# Altium schematic symbol library lib_datalogger.SchLib: 1246 symbols (part 5 of 16)
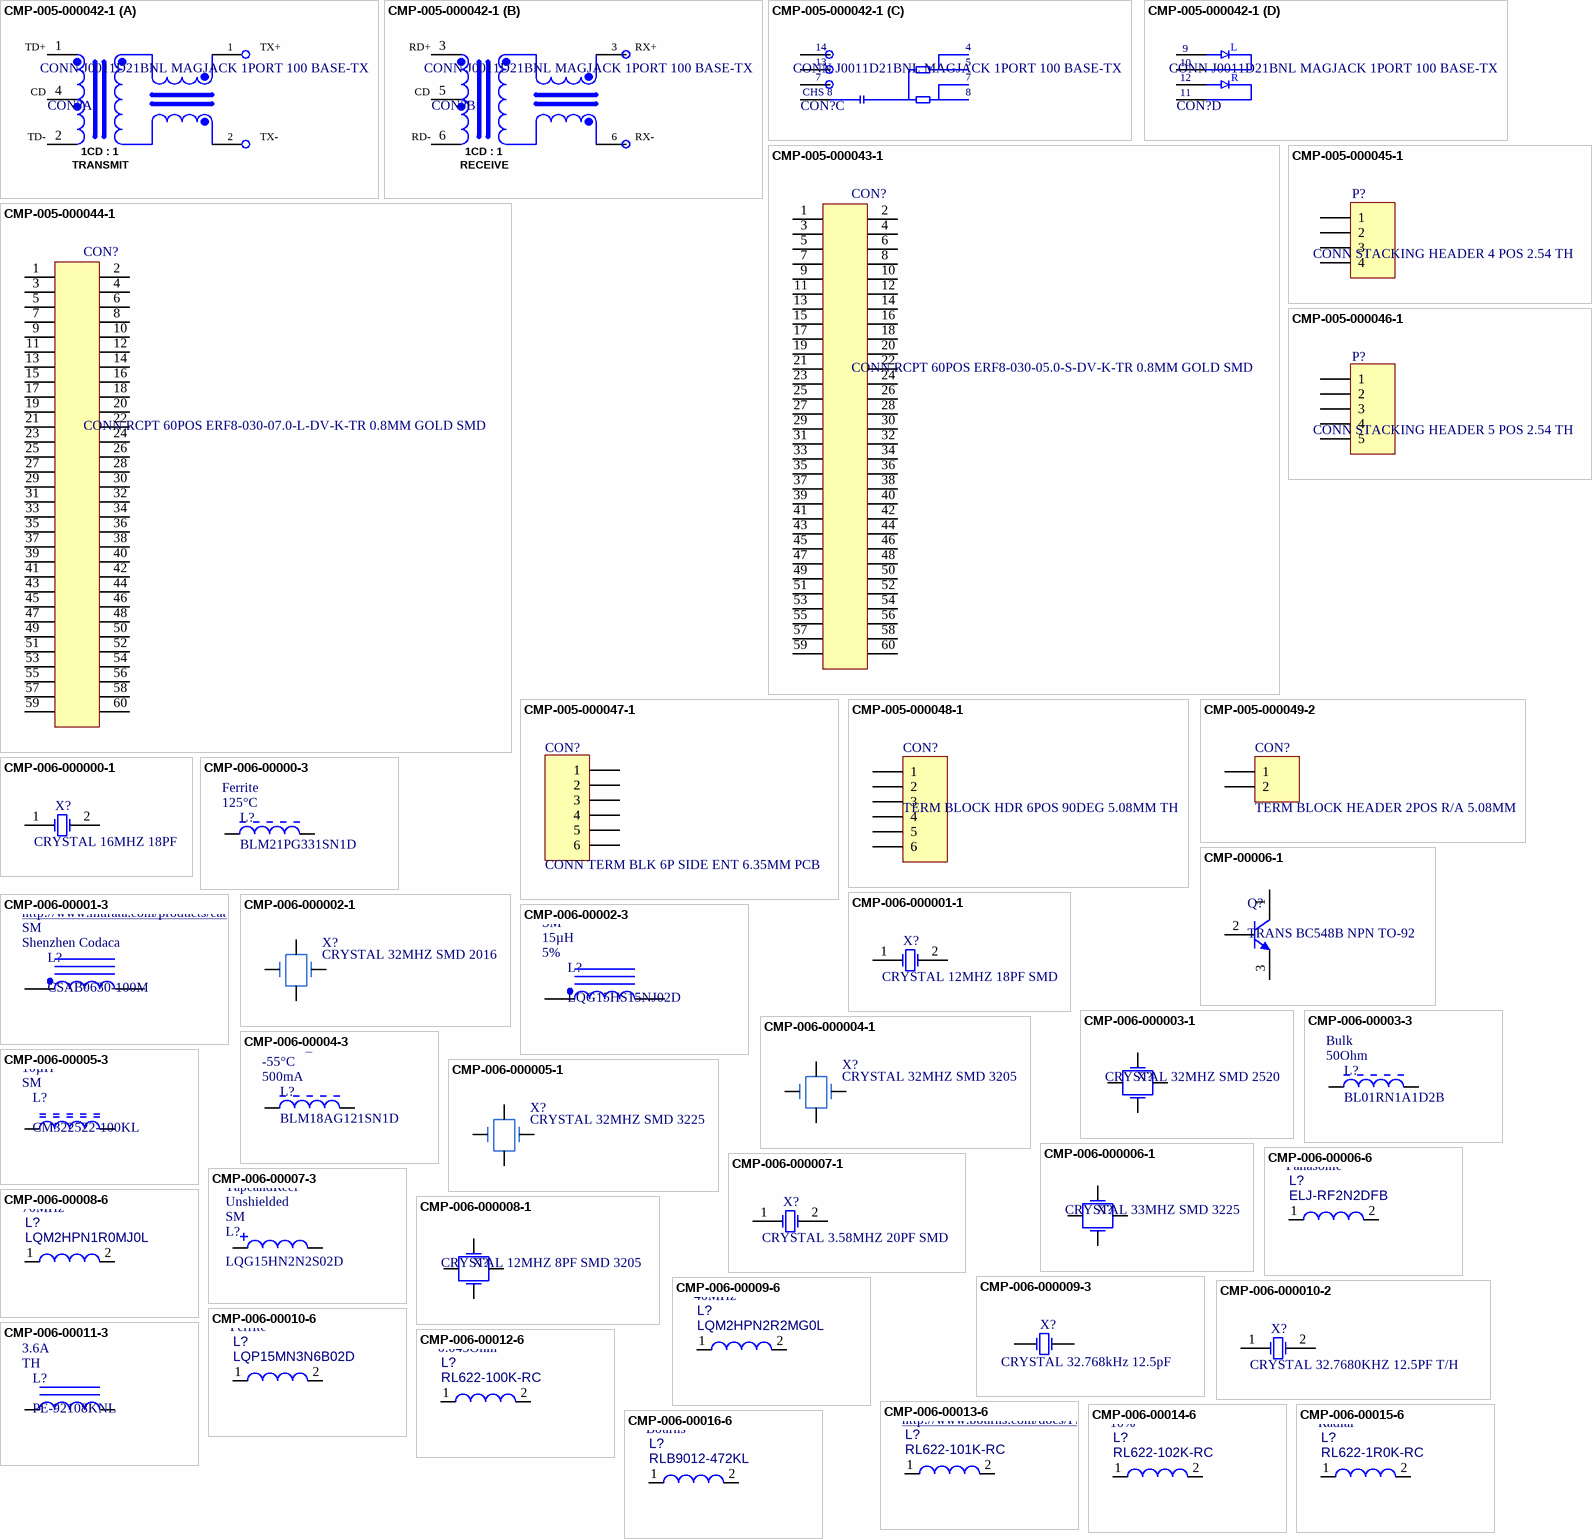
[diagram p47: symbols CMP-005-000042-1 to CMP-006-00016-6]

## CMP-005-000042-1
designator CON?, comment CONN J0011D21BNL MAGJACK 1PORT 100 BASE-TX
CONN MAGJACK 1PORT 100 BASE-TX; Manufacturer: Pulse Electronics Corporation; LED Color: Green - Yellow; Shielding: Shielded, EMI Finger; Number of Cores per Jack: 4; Number of Ports: 1; Tab Direction: Down; Shield Material: Brass; Connector Type: RJ45; Pricing 1: 1=7.92, 10=7.59, 25=6.93, 50=6.6, 100=6.27, 250=5.61, 500=5.28, 1000=4.62 (USD); Mounting Type: Through Hole; Stock 1: 4306; Height Above Board: 0.545" (13.84mm); Category: Connectors, Interconnects; Part Status: Active; Contact Material: Phosphor Bronze; Termination: Solder; Source: mits.SchLib; Number of Rows: 1; Operating Temperature: 0°C ~ 70°C; RoHS: RoHS Compliant; Contact Finish: Gold; ComponentLink1Description: http://productfinder.pulseeng.com/products/datasheets/J403.pdf; Orientation: 90° Angle (Right); Manufacturer Part Number: J0011D21BNL; Housing Material: Thermoplastic; Applications: 10/100 Base-TX, AutoMDIX; Design Item ID: CONN J0011D21BNL MAGJACK 1PORT 100 BASE-TX; ComponentLink1URL: http://productfinder.pulseeng.com/products/datasheets/J403.pdf; Contact Finish Thickness: 15µin (0.38µm); Packaging: Tube; Features: Board Guide
footprint J0011
footprint J0011
part A pins: 1 TD+, 2 TD-, 4 CT
part B pins: 3 RD+, 5 CT, 6 RD-
part C pins: 7, 8, 13, 14
part D pins: 9, 10, 11, 12
part A text: 1         TX+; CD; 2         TX-; 1CD : 1; TRANSMIT
part B text: 3      RX+; CD; 6      RX-; 1CD : 1; RECEIVE
part C text: CHS 8
part D text: L; R

## CMP-005-000043-1
designator CON?, comment CONN RCPT 60POS ERF8-030-05.0-S-DV-K-TR 0.8MM GOLD SMD
CONN RCPT 60POS 0.8MM GOLD SMD; Manufacturer: Samtec Inc.; Mated Stacking Heights: 7mm, 10mm, 13mm, 14mm, 20mm; Connector Type: Socket, Center Strip Contacts; Number of Positions: 60; Pitch: 0.031" (0.80mm); Design Item ID: CONN RCPT 60POS ERF8-030-05.0-S-DV-K-TR 0.8MM GOLD SMD; Manufacturer Part Number: ERF8-030-05.0-S-DV-K-TR; Contact Finish Thickness: 30µin (0.76µm); Source: mits.SchLib; Part Status: Active; Contact Finish: Gold; Mounting Type: Surface Mount; Category: Connectors, Interconnects; Height Above Board: 0.210" (5.33mm); Pricing 1: 1=8.69, 10=8.324, 25=7.6, 50=7.238, 100=6.8761 (USD); Packaging: Cut Tape (CT); RoHS: RoHS Compliant; Features: Board Guide, Pick and Place; ComponentLink1Description: http://suddendocs.samtec.com/prints/erf8-xxx-xx.x-x-dv-xxxx-xx-mkt.pdf; Stock 1: 735; ComponentLink1URL: http://suddendocs.samtec.com/prints/erf8-xxx-xx.x-x-dv-xxxx-xx-mkt.pdf; Number of Rows: 2
footprint ERF8-030-07.0-L-DV-TR
footprint ERF8-030-05.0-X-DV
pins: 1, 2, 3, 4, 5, 6, 7, 8, 9, 10, 11, 12, 13, 14, 15, 16, 17, 18, 19, 20, 21, 22, 23, 24, 25, 26, 27, 28, 29, 30, 31, 32, 33, 34, 35, 36, 37, 38, 39, 40, 41, 42, 43, 44, 45, 46, 47, 48, 49, 50, 51, 52, 53, 54, 55, 56, 57, 58, 59, 60

## CMP-005-000044-1
designator CON?, comment CONN RCPT 60POS ERF8-030-07.0-L-DV-K-TR 0.8MM GOLD SMD
CONN RCPT 60POS 0.8MM GOLD SMD; Manufacturer: Samtec Inc; eVendor#: ERF8-030-07.0-L-DV-EGPS-TR-ND; Obs: Comprar diretamente coma  SAMTEC; eVendor: Digi-Key; eVendorPrice: 4,5095; Part#: ERF8-030-07.0-L-DV-K-TR; Source: mits.SchLib; Design Item ID: CONN RCPT 60POS ERF8-030-07.0-L-DV-K-TR 0.8MM GOLD SMD; MSRP: 4,5095; MOQ: 300; Datasheet: http://www.samtec.com/ftppub/cpdf/ERF8-XXX-XX.X-X-DV-XXXX-TR-MKT.pdf
footprint ERF8-030-07.0-L-DV-TR
footprint ERF8-030-07.0-L-DV-TR
pins: 1, 2, 3, 4, 5, 6, 7, 8, 9, 10, 11, 12, 13, 14, 15, 16, 17, 18, 19, 20, 21, 22, 23, 24, 25, 26, 27, 28, 29, 30, 31, 32, 33, 34, 35, 36, 37, 38, 39, 40, 41, 42, 43, 44, 45, 46, 47, 48, 49, 50, 51, 52, 53, 54, 55, 56, 57, 58, 59, 60

## CMP-005-000045-1
designator P?, comment CONN STACKING HEADER 4 POS 2.54 TH
Conn Unshrouded Header HDR 4 POS 2.54mm Solder ST Thru-Hole; Manufacturer: Samtec; Manufacturer Part Number: HTSW-150-20-TM-S; Gender: Male; Max Voltage Rating (AC): 550V; Number of Contacts: 50; Max Current Rating: 7.6A; ComponentLink2Description: https://datasheet.ciiva.com/9714/htsw-th-9714606.pdf?src-supplier=Avnet; Category: Connectors; Number of Rows: 1; ComponentLink1URL: https://datasheet.ciiva.com/29150/77311-29150409.pdf?src-supplier=Digi-Key; ComponentLink2URL: https://datasheet.ciiva.com/9714/htsw-th-9714606.pdf?src-supplier=Avnet; Contact Plating: Tin; Design Item ID: CONN STACKING HEADER 4 POS 2.54 TH; RoHS: Yes; Max Operating Temperature: 105°C; Contact Material: Bronze; Termination: Solder; Orientation: Straight; Depth: 2.48mm; Pitch: 2.54mm; Length: 127mm; Min Operating Temperature: -55°C; Housing Color: Natural; ComponentLink1Description: https://datasheet.ciiva.com/29150/77311-29150409.pdf?src-supplier=Digi-Key; RoHS Compliant: Yes; Housing Material: Polymer; Source: mits.SchLib
footprint CONN_STACKING_HEADER_4POS
footprint CONN_STACKING_HEADER_4POS
pins: 1, 2, 3, 4

## CMP-005-000046-1
designator P?, comment CONN STACKING HEADER 5 POS 2.54 TH
Conn Unshrouded Header HDR 5 POS 2.54mm Solder ST Thru-Hole; Manufacturer: Samtec; Manufacturer Part Number: HTSW-150-20-TM-S; Max Voltage Rating (AC): 550V; Number of Contacts: 50; Max Current Rating: 7.6A; Gender: Male; Pitch: 2.54mm; ComponentLink2Description: https://datasheet.ciiva.com/16733/77311-16733275.pdf?src-supplier=Avnet+Europe; Termination: Solder; RoHS Compliant: Yes; Contact Material: Bronze; ComponentLink4Description: https://datasheet.ciiva.com/9714/htsw-th-9714606.pdf?src-supplier=Avnet; Contact Plating: Tin; ComponentLink1URL: https://datasheet.ciiva.com/10149/77311-10149019.pdf?src-supplier=Avnet; ComponentLink2URL: https://datasheet.ciiva.com/16733/77311-16733275.pdf?src-supplier=Avnet+Europe; Length: 127mm; RoHS: Yes; ComponentLink3Description: https://datasheet.ciiva.com/724/77311-724067.pdf?src-supplier=Digi-Key; Orientation: Straight; Pricing 1: 1=4,62000, 10=4,43600, 100=3,69660, 500=3,14212, 1000=2,68004 (USD); Stock 1: 132; Max Operating Temperature: 105°C; Housing Material: Polymer; Design Item ID: CONN STACKING HEADER 5 POS 2.54 TH; Source: mits.SchLib; ComponentLink3URL: https://datasheet.ciiva.com/724/77311-724067.pdf?src-supplier=Digi-Key; Housing Color: Natural; Category: Connectors; ComponentLink1Description: https://datasheet.ciiva.com/10149/77311-10149019.pdf?src-supplier=Avnet; Depth: 2.48mm; Number of Rows: 1; Min Operating Temperature: -55°C; ComponentLink4URL: https://datasheet.ciiva.com/9714/htsw-th-9714606.pdf?src-supplier=Avnet
footprint CONN_STACKING_HEADER_5POS
footprint CONN_STACKING_HEADER_5POS
pins: 1, 2, 3, 4, 5

## CMP-005-000047-1
designator CON?, comment CONN TERM BLK 6P SIDE ENT 6.35MM PCB
Conn PC Terminal Block 6 POS 6.35mm Solder ST Thru-Hole 41A Cardboard; Manufacturer Part Number: 920-0085-01; Manufacturer: SchmartBoard; Voltage: 600V; Number of Levels: 1; Wire Gauge (Min): 10AWG; Wire Gauge (Max): 24AWG; Current: 30A; Number of Positions Per Level: 6; Packaging: Bulk; Color: Green; Mount: Through Hole; Design Item ID: CONN TERM BLK 6P SIDE ENT 6.35MM PCB; ComponentLink1URL: http://www.mouser.com/ds/2/356/schmartboard_pd_920-0085-01_b-539867.pdf?src-supplier=Mouser; ComponentLink1Description: http://www.mouser.com/ds/2/356/schmartboard_pd_920-0085-01_b-539867.pdf?src-supplier=Mouser; Contact Plating: Tin; RoHS: No; Stock 1: 36; Termination: Screwless; Pricing 1: 1=5,38000, 10=5,23200, 50=4,89000, 100=4,49870, 250=4,15644, 500=3,96082, 1000=3,71632 (USD); Source: mits.SchLib; ComponentLink2URL: https://media.digikey.com/pdf/Data%20Sheets/Phoenix%20Contact%20PDFs/1017525_Ds.pdf?src-supplier=Digi-Key; ComponentLink2Description: https://media.digikey.com/pdf/Data%20Sheets/Phoenix%20Contact%20PDFs/1017525_Ds.pdf?src-supplier=Digi-Key; Category: Headers and Wire Housings
pins: 1, 2, 3, 4, 5, 6

## CMP-005-000048-1
designator CON?, comment TERM BLOCK HDR 6POS 90DEG 5.08MM TH
PIN HEADER, EUROSTYLE, 6POS, 0.2IN; Connector Type:Terminal Block, Eurostyle; Product Range:39860 Series; Connector Mounting:PCB Mount; Pitch Spacing:5.08mm; No. of Contacts:6; Wire Size AWG Min:-; Wire Size AWG Max:-; Colour:Black ;RoHS Compliant: Yes; Manufacturer Part Number: 39532-1006; Manufacturer: Molex Connector Corporation; Current rating: 15A; Voltage: 300V; Number of Contacts: 6; Gender: Male; Pitch: 0.200" (5.08mm); Material Flammability Rating: UL94 V-0; Contact Tail Length: 0.150" (3.81mm); Header Orientation: 90°, Right Angle; Max Voltage Rating (DC): 300.3kV; Number of Levels: 1; ELV: Compliant; ComponentLink2URL: https://datasheet.ciiva.com/5190/0395321006-terminal-blocks-166209-5190898.pdf?src-supplier=Mouser; ComponentLink3Description: https://datasheet.ciiva.com/7978/1480852-7978999.pdf?src-supplier=Element14; ComponentLink1URL: http://www.molex.com/pdm_docs/sd/395321002_sd.pdf; Housing Color: Black; Current - UL: 15A; Features: -; ComponentLink4URL: https://datasheet.ciiva.com/810/395321002-sd-810100.pdf?src-supplier=Digi-Key; Category: Connectors, Interconnects; Ingress Protection: -; ComponentLink1Description: http://www.molex.com/pdm_docs/sd/395321002_sd.pdf; Number of Positions: 6; Number of Rows: 1; Max Operating Temperature: 105°C; Contact Plating: Tin; Wire Strip Length: -; ComponentLink3URL: https://datasheet.ciiva.com/7978/1480852-7978999.pdf?src-supplier=Element14; Min Operating Temperature: -40°C; Plug Wire Entry: -; Stock 1: 8671; Current: 15A; Current - IEC: -; Stock 2: 3509; Length: 32.5mm; Type: Header, Male Pins, Shrouded (4 Side); Number of Circuits: 6; Package Quantity: 1; Flammability Rating: UL94 V-0; Lead Free: Lead Free; Contact Material: Brass; Voltage - UL: 300V; Voltage Rating: 300V; Mount: Through Hole; ComponentLink2Description: https://datasheet.ciiva.com/5190/0395321006-terminal-blocks-166209-5190898.pdf?src-supplier=Mouser; Source: mits.SchLib; Mounting Type: Through Hole; Operating Temperature: -40°C ~ 105°C; RoHS: RoHS Compliant; Termination: Solder; Part Status: Active; Wire Gauge or Range - AWG: -; Pricing 2: 1=1,81000, 10=1,64100, 100=1,40670, 500=1,17228, 1000=1,00481, 5000=0,89093, 10000=0,87083 (USD); Orientation: Right Angle; ComponentLink4Description: https://datasheet.ciiva.com/810/395321002-sd-810100.pdf?src-supplier=Digi-Key; Packaging: Bulk; Screw Size: -; Wire Gauge or Range - mm²: -; Pricing 1: 1=1.7, 10=1.544, 50=1.386, 100=1.323, 250=1.197, 500=1.1025, 1000=0.945, 2500=0.882, 5000=0.8379 (USD); Housing Material: Polyamide (PA66), Nylon 6/6; Positions Per Level: 6; Voltage - IEC: -; Number of Positions Per Level: 6; Insulation Height: 0.472" (12.00mm); Contact Mating Finish: Tin; Connector Type: Terminal Block; Termination Style: Solder; Torque - Screw: -; Width: 12mm; Color: Black; Design Item ID: TERM BLOCK HDR 6POS 90DEG 5.08MM TH
footprint TERMINAL_BLOCKS_MSTB_6POS
footprint TERMINAL_BLOCKS_MSTB_6POS
pins: 1, 2, 3, 4, 5, 6

## CMP-005-000049-2
designator CON?, comment TERM BLOCK HEADER 2POS R/A 5.08MM
TERM BLOCK HDR 2POS R/A 5.08MM; Manufacturer: Phoenix Contact; Manufacturer Part Number: 1757242; Number of Positions: 2; Voltage - IEC: 400V; Current - UL: 15A; Header Orientation: 90°, Right Angle; Voltage - UL: 300V; Number of Levels: 1; Current - IEC: 12A; Pitch: 0.200" (5.08mm); Plug Wire Entry: -; Features: -; Operating Temperature: -; Contact Mating Finish: Tin; Source: mits.SchLib; Wire Gauge or Range - AWG: -; Color: Green; Category: Connectors, Interconnects; Part Status: Active; Termination Style: Solder; Design Item ID: TERM BLOCK HEADER 2POS R/A 5.08MM; RoHS: RoHS Compliant; Mounting Type: Through Hole; Wire Gauge or Range - mm²: -; Pricing 1: 1=0.59, 10=0.563, 50=0.5386, 100=0.5239, 250=0.4896, 500=0.45044, 1000=0.408, 2500=0.3888, 5000=0.3648 (USD); ComponentLink1URL: http://media.digikey.com/pdf/Data%20Sheets/Phoenix%20Contact%20PDFs/1757242.pdf; Stock 1: 14081; Type: Header, Male Pins, Shrouded (4 Side); Positions Per Level: 2; ComponentLink1Description: http://media.digikey.com/pdf/Data%20Sheets/Phoenix%20Contact%20PDFs/1757242.pdf; Packaging: Bulk
footprint MSTBA 2G
footprint MSTBA 2G
pins: 1, 2

## CMP-006-000000-1
designator X?, comment CRYSTAL 16MHZ 18PF
16.000MHZ-B2.            Crystal; Manufacturer Part Number: HCM4912000000ABJT; Manufacturer: Citizen Finedevice Co Ltd; Frequency: 12MHz; Series Resistance: 40R; Frequency Stability: ±50ppm; Operating Mode: Fundamental; ESR (Equivalent Series Resistance): 80 Ohm; Frequency Tolerance: ±30ppm; Tolerance: 20ppm; Package Quantity: 1000; Operating Temperature: -10°C ~ 60°C; Length: 11.5mm; REACH SVHC: Yes; ComponentLink6Description: https://datasheet.ciiva.com/7998/abl-7998398.pdf?src-supplier=Element14; Source: mits.SchLib; ComponentLink3Description: https://datasheet.ciiva.com/862/abl-862058.pdf?src-supplier=Digi-Key; Height - Seated (Max): 0.169" (4.30mm); Pricing 1: 1=0,33000, 10=0,27500, 50=0,24760, 100=0,22000, 500=0,20900, 1000=0,17600, 2500=0,16500, 5000=0,15950, 10000=0,15400 (USD); Size / Dimension: 0.449" L x 0.190" W (11.40mm x 4.83mm); Depth: 5mm; ComponentLink5Description: https://datasheet.ciiva.com/7998/abl-7998397.pdf?src-supplier=Element14; Package / Case: HC49/US; ComponentLink3URL: https://datasheet.ciiva.com/862/abl-862058.pdf?src-supplier=Digi-Key; Design Item ID: CRYSTAL 16MHZ 18PF; Mounting Type: Surface Mount; Lead Free: Lead Free; Width: 5mm; RoHS: RoHS Compliant; ComponentLink6URL: https://datasheet.ciiva.com/7998/abl-7998398.pdf?src-supplier=Element14; Radiation Hardening: No; Number of Pins: 2; Category: Crystals, Oscillators, Resonators; ComponentLink1Description: http://cfd.citizen.co.jp/english/prod-tech/product/pdf/datasheet_AT/HCM49_E.pdf; Mount: Through Hole; ComponentLink4URL: https://datasheet.ciiva.com/3175/abl-3175227.pdf?src-supplier=Avnet; ComponentLink2URL: https://datasheet.ciiva.com/4945/abl-10083-4945184.pdf?src-supplier=Mouser; Ratings: -; Load Capacitance: 18pF; Stock 1: 4246; ComponentLink2Description: https://datasheet.ciiva.com/4945/abl-10083-4945184.pdf?src-supplier=Mouser; Min Operating Temperature: -20°C; Height: 0.138inch; Termination: Radial; Part Status: Active; ComponentLink1URL: http://cfd.citizen.co.jp/english/prod-tech/product/pdf/datasheet_AT/HCM49_E.pdf; Max Operating Temperature: 70°C; ComponentLink5URL: https://datasheet.ciiva.com/7998/abl-7998397.pdf?src-supplier=Element14; ComponentLink4Description: https://datasheet.ciiva.com/3175/abl-3175227.pdf?src-supplier=Avnet; Type: MHz Crystal; Packaging: Cut Tape (CT)
footprint CFS206
footprint Crystal HP59US
pins: 1 OSC1, 2 OSC2

## CMP-006-00000-3
designator L?, comment BLM21PG331SN1D  Max Operating Temperature: 125°C  Core Material: Ferrite  Case/Package: 0805  Mounting Technology: SM  Packaging: TapeandReel  Current Rating: 1.5A  Impedance: 330Ohm  Min Operating Temperature: -55°C  RoHS Compliant: True  Datasheet Version: Nov-11  Package Quantity: 4000  Package Description: 2-Pin Surface Mount Device, Body 2 x1.25 mm  Resistance: 90mohm  Tolerance: 25%  Manufacturer: Murata
IND, Chip Ferrite Bead, 330 Ohm, +/- 25%, 1.5 A, -55 to 125 degC, 0805 (2012 Metric), Tape and Reel; Datasheet URL: http://psearch.en.murata.com/inductor/product/LQG15HS15NJ02_.pdf; Max Current Rating: 1.5A; Package Reference: 0805
footprint INDC2013X105X50ML20T20 (Chip Inductor, 2-Leads, Body 2.2x1.45mm, IPC Low Density)
footprint INDC2013X105X50LL20T20 (Chip Inductor, 2-Leads, Body 2.2x1.45mm, IPC High Density)
footprint INDC2013X105X50NL20T20 (Chip Inductor, 2-Leads, Body 2.2x1.45mm, IPC Medium Density)
pins: 1, 2

## CMP-00006-1
designator Q?, comment TRANS BC548B NPN TO-92
Trans GP BJT NPN 30V 0.1A 500mW Automotive 3-Pin TO-92 Ammo; hFE Min: 110; Element Configuration: Single; Emitter Base Voltage (VEBO): 5V; Number of Elements: 1; Transition Frequency: 300MHz; Max Collector Current: 100mA; Collector-emitter Voltage-Max: 250mV; Collector Emitter Saturation Voltage: 300mV; Max Power Dissipation: 625mW; REACH SVHC: No SVHC; Collector Emitter Voltage (VCEO): 30V; Polarity: NPN; Number of Pins: 3; Series: -; Frequency: 300MHz; Packaging: Bulk; Package Quantity: 5000; Voltage Rating (DC): 30V; Collector Emitter Breakdown Voltage: 30V; Lead Free: Lead Free; Max Breakdown Voltage: 30V; Case/Package: TO-92-3; Min Operating Temperature: -55°C; RoHS Compliant: Yes; Max Operating Temperature: 150°C; Collector Base Voltage (VCBO): 30V; Current Rating: 100mA; Power Dissipation: 500mW; Mount: Through Hole; Gain Bandwidth Product: 300MHz; Weight: 0.2g
footprint ONSC-TO-92-3-29-11 (TO, 3-Leads, Body Dia 4.7mm, Pitch 1.27mm)
pins: 1 C, 2 B, 3 E

## CMP-006-000001-1
designator X?, comment CRYSTAL 12MHZ 18PF SMD
CRYSTAL 12.0000MHZ 18PF SMD; Manufacturer: Citizen Finedevice Co Ltd; Manufacturer Part Number: HCM4912000000ABJT; Operating Mode: Fundamental; ESR (Equivalent Series Resistance): 80 Ohm; Frequency Tolerance: ±30ppm; Frequency Stability: ±50ppm; ComponentLink1URL: http://cfd.citizen.co.jp/english/prod-tech/product/pdf/datasheet_AT/HCM49_E.pdf; Operating Temperature: -10°C ~ 60°C; Packaging: Cut Tape (CT); Package / Case: HC49/US; Pricing 1: 1=0.66, 10=0.55, 50=0.495, 100=0.44, 500=0.418 (USD); Height - Seated (Max): 0.169" (4.30mm); Category: Crystals, Oscillators, Resonators; RoHS: RoHS Compliant; Source: mits.SchLib; Stock 1: 832; Size / Dimension: 0.449" L x 0.190" W (11.40mm x 4.83mm); Part Status: Active; Ratings: -; Mounting Type: Surface Mount; Type: MHz Crystal; ComponentLink1Description: http://cfd.citizen.co.jp/english/prod-tech/product/pdf/datasheet_AT/HCM49_E.pdf; Load Capacitance: 18pF; Frequency: 12MHz; Design Item ID: CRYSTAL 12MHZ 18PF SMD
footprint CFS206
footprint XTAL-SMD
pins: 1 OSC1, 2 OSC2

## CMP-006-00001-3
designator L?, comment CSAB0630-100M  Manufacturer: Shenzhen Codaca  Mounting Technology: SM  Tolerance: 20%  RoHS Compliant: Unknown  Datasheet Version: Mar-14  Package Description: 2-Pin Surface Mount Device, Body 6 x 6 mm  Inductance: 10µH
Molded Inductor, 10 uH, +/- 20%, 77.2 mOhm, -55 to 125 degC, 2-Pin SMD, RoHS, Tape and Reel; Datasheet URL: http://www.murata.com/products/catalog/pdf/c31e.pdf; Manufacturer URL: www.codaca.com.cn; Case/Package: CSAB0630-100M; Package Reference: CSAB0630-100M
footprint CODA-CSAB0630-100M_V (Molded Inductor, 2-Leads, Body 6.2x6.2mm)
pins: 1, 2

## CMP-006-000002-1
designator X?, comment CRYSTAL 32MHZ SMD 2016
MURATA - XRCGB32M000F2P00R0 - Crystal, 32 MHz, SMD, 2mm x 1.6mm, 20 ppm, 6 pF, 20 ppm, XRCGB Series; ESR (Equivalent Series Resistance): 100R; Tolerance: 20ppm; Load Capacitance: 6pF; ComponentLink3URL: http://www.murata.com/en-eu/products/productdata/8796853108766/L0445E.pdf?src-supplier=Digi-Key; Length: 2mm; ComponentLink5Description: http://www.farnell.com/datasheets/1867890.pdf?src-supplier=Element14; Max Operating Temperature: 85°C; Pricing 1: 1=0,33000, 10=0,27800, 50=0,25060, 100=0,22280, 500=0,21166, 1000=0,17824 (USD); Height: 0.028inch; Source: mits.SchLib; ComponentLink4URL: https://www.murata.com/en-global/products/productdata/8796853108766/L0445E.pdf?src-supplier=Digi-Key; Min Operating Temperature: -30°C; Termination: SMD/SMT; ComponentLink2Description: http://www.mouser.com/ds/2/281/p79e-522722.pdf?src-supplier=Mouser; ComponentLink2URL: http://www.mouser.com/ds/2/281/p79e-522722.pdf?src-supplier=Mouser; RoHS: Yes; REACH SVHC: No SVHC; ComponentLink3Description: http://www.murata.com/en-eu/products/productdata/8796853108766/L0445E.pdf?src-supplier=Digi-Key; Width: 1.6mm; Design Item ID: CRYSTAL 32MHZ SMD 2016; ComponentLink1URL: http://www.farnell.com/datasheets/1867890.pdf?src-supplier=Farnell; RoHS Compliant: Yes; Manufacturer Part Number: XRCGB32M000F2P00R0; Manufacturer: Murata; ComponentLink6Description: http://www.farnell.com/datasheets/1867890.pdf?src-supplier=Newark; Number of Pins: 3; Packaging: Tape and Reel; Frequency: 32MHz; Frequency Stability: 20ppm; ComponentLink4Description: https://www.murata.com/en-global/products/productdata/8796853108766/L0445E.pdf?src-supplier=Digi-Key; Package Quantity: 3000; Frequency Tolerance: 20ppm; Series Resistance: 100R; Case/Package: SMD/SMT; ComponentLink6URL: http://www.farnell.com/datasheets/1867890.pdf?src-supplier=Newark; Mount: Surface Mount; Category: Crystals; ComponentLink5URL: http://www.farnell.com/datasheets/1867890.pdf?src-supplier=Element14; ComponentLink1Description: http://www.farnell.com/datasheets/1867890.pdf?src-supplier=Farnell; Stock 1: 287
footprint 4-SMD 2520
footprint 4-SMD 2016
pins: 1, 2, 3, 4

## CMP-006-00002-3
designator L?, comment LQG15HS15NJ02D  Tolerance: 5%  Inductance: 15µH  Mounting Technology: SM  Current Rating: 300mA  RoHS Compliant: True  Max Operating Temperature: 125°C  Package Description: 2-Pin Surface Mount Device, Body 1 x 0.5 mm  Self Resonant Frequency: 2.5GHz  Package Reference: 0402  Shielding: Unshielded  Q Factor: 8  Min Operating Temperature: -55°C  Datasheet Version: Nov-16  Manufacturer: Murata  Packaging: TapeandReel  Core Material: Air  Package Quantity: 10000
Chip Inductor, 15 nH, +/- 5%, 100 MHz, -55 to 125 degC, 0402 (1005 Metric), RoHS, Paper Tape; Datasheet URL: http://psearch.en.murata.com/inductor/product/LQG15HN2N2S02_.pdf; Case/Package: 0402; Inductance Tolerance: 5%
footprint INDC1005X55X25LL05T10_A (Chip Inductor, 2-Leads, Body 1.05x0.55mm, IPC High Density)
footprint INDC1005X55X25ML05T10_A (Chip Inductor, 2-Leads, Body 1.05x0.55mm, IPC Low Density)
footprint INDC1005X55X25NL05T10_A (Chip Inductor, 2-Leads, Body 1.05x0.55mm, IPC Medium Density)
pins: 1, 2

## CMP-006-000003-1
designator X?, comment CRYSTAL 32MHZ SMD 2520
Crystal, 32 MHz, SMD, 2mm x 1.6mm, 20 ppm, 12 pF, 20 ppm,; Manufacturer 1: TAITIEN Elec; Manufacturer Part Number 1: XYDCELNANF-32M; Load Capacitance: 12pF; Tolerance: 20ppm; ESR (Equivalent Series Resistance): 40R; Mount: Surface Mount; RoHS: Yes; Min Operating Temperature: -40°C; Frequency: 32MHz; Category: Crystals; Case/Package: SMD/SMT; Max Operating Temperature: 85°C; Source: mits.SchLib; Number of Pins: 4; Design Item ID: CRYSTAL 32MHZ SMD 2520; Length: 2.5mm; Frequency Tolerance: 20ppm; Packaging: Cut Tape; Termination: SMD/SMT; Series Resistance: 40R; Width: 2mm
footprint 4-SMD 3225
footprint 4-SMD 2520
pins: 1, 2, 3, 4

## CMP-006-00003-3
designator L?, comment BL01RN1A1D2B  Impedance: 50Ohm  Packaging: Bulk  Package Reference: INDA65-500X360  Case/Package: Axial  Package Quantity: 500  Diameter: 3.6mm  Datasheet Version: May-16  Min Operating Temperature: -40°C  Current Rating: 7A  Mounting Technology: TH  Manufacturer: Murata  Core Material: Ferrite  RoHS Compliant: True  Package Description: 2-Pin Axial Lead, Dia 3.6 mm, Body Length 5 mm  Max Operating Temperature: 85°C  Pins: 2
EMI Suppression Filter (Lead Type EMIFIL(R)), 7 A, -40 to 85 degC, 2-Pin THD, RoHS, Bulk; Datasheet URL: http://www.murata.com/en-us/products/productdata/8796738977822/ENFA0005.pdf; Max Current Rating: 7A
footprint INDA65-500X360 (Axial Lead, 2-Leads, Dia 3.6mm, Body Length 5mm, Pin Spacing 7.9mm)
pins: 1, 2

## CMP-006-000004-1
designator X?, comment CRYSTAL 32MHZ SMD 3205
Crystal, 32 MHz, SMD, 2mm x 1.6mm, 20 ppm, 12 pF, 20 ppm,; Design Item ID: CRYSTAL 32MHZ SMD 3205; Source: mits.SchLib
footprint 4-SMD 2520
footprint 4-SMD 2520
pins: 1, 2, 3, 4

## CMP-006-00004-3
designator L?, comment BLM18AG121SN1D  Max Current Rating: 500mA  Min Operating Temperature: -55°C  Package Reference: BLM18_H950-2  Max Operating Temperature: 125°C  Tolerance: 25%  Impedance: 120Ohm  Core Material: Ferrite  Datasheet Version: Jun-12  Manufacturer: Murata  Packaging: TapeandReel  Resistance: 200mohm  Package Quantity: 4000  Case/Package: 0603  RoHS Compliant: True
Chip Ferrite Bead for General Use, 120 Ohm, 500 mA, -55 to 125 degC, 0603 (1608 Metric), RoHS, Tape and Reel; Current Rating: 500mA; Datasheet URL: https://statics3.seeedstudio.com/images/opl/datasheet/303010016.pdf
footprint MURA-BLM18-F-H1-CHIP-2_V (Chip Ferrite Bead, 2-Leads, Body 1.6x0.8mm, Height 0.95mm, Flow)
pins: 1, 2

## CMP-006-000005-1
designator X?, comment CRYSTAL 32MHZ SMD 3225
32MHz ±10ppm 12pF 40Ω SMD-3225_4P SMD Crystal Resonators RoHS; Manufacturer: YXC; Manufacturer Part Number 1: X322532MOB4SI; Tolerance: 20ppm; ESR (Equivalent Series Resistance): 40R; Supplier Unit Price 1: 0.115; Case/Package: SMD/SMT; RoHS: Yes; Termination: SMD/SMT; Manufacturer 1: YXC; Load Capacitance: 12pF; Frequency Tolerance: 10ppm; Mount: Surface Mount; Packaging: Cut Tape; Source: mits.SchLib; Category: Crystals; Pricing 1: 5=0,15050, 50=0,11630, 150=0,10990, 500=0,10360, 2500=0,10090, 5000=0,09960, 5=0,14460, 50=0,11180, 150=0,10560, 500=0,09960, 2500=0,09690, 5000=0,09570, 5=0,75320, 50=0,58230, 150=0,55020, 500=0,51870, 2500=0,50500, 5000=0,49840, 5=0,71830, 50=0,55530, 150=0,52470, 500=0,49470, 2500=0,48160, 5000=0,47530, 5=0,09660, 50=0,07460, 150=0,07050, 500=0,06650, 2500=0,06470, 5000=0,06390, 5=0,08370, 50=0,06470, 150=0,06120, 500=0,05770, 2500=0,05610, 5000=0,05540, 5=0,89450, 50=0,69150, 150=0,65330, 500=0,61600, 2500=0,59970, 5000=0,59190, 5=12,56650, 50=9,71450, 150=9,17900, 500=8,65450, 2500=8,42500, 5000=8,31580, 5=0,47570, 50=0,36770, 150=0,34750, 500=0,32760, 2500=0,31890, 5000=0,31480, 5=8,84730, 50=6,83940, 150=6,46240, 500=6,09310, 2500=5,93150, 5000=5,85460, 5=0,98290, 50=0,75980, 150=0,71800, 500=0,67690, 2500=0,65900, 5000=0,65040, 5=0,15410, 50=0,11910, 150=0,11250, 500=0,10610, 2500=0,10330, 5000=0,10200, 5=0,11500, 50=0,08890, 150=0,08400, 500=0,07920, 2500=0,07710, 5000=0,07610 (AUD); Frequency: 32MHz; Manufacturer Part Number: X322532MOB4SI; Series Resistance: 40R; Stock 1: 50570; Max Operating Temperature: 85°C; Design Item ID: CRYSTAL 32MHZ SMD 3225; Number of Pins: 4; Min Operating Temperature: -40°C
footprint 4-SMD 2520
footprint 4-SMD 3225
pins: 1, 2, 3, 4

## CMP-006-00005-3
designator L?, comment CM322522-100KL  Mounting Technology: SM  Inductance: 10µH  Current Rating: 140mA  Q Factor: 30  Min Operating Temperature: -20°C  Self Resonant Frequency: 30MHz  Case/Package: 1210  Pins: 2  Package Description: 2-Pin Surface Mount Device, Body 3.2 x 2.5 mm  Manufacturer: Bourns  RoHS Compliant: True  Core Material: Ferrite  Shielding: Unshielded  Max Operating Temperature: 100°C  Inductance Tolerance: 10%  Resistance: 2.1Ohm  Packaging: TapeandReel  Package Quantity: 1  Datasheet Version: Aug-14
Chip Inductor, 10 uH, +/- 10%, -40 to 125 degC, 1210 (3225 Metric), RoHS, Tape and Reel; Datasheet URL: http://www.murata.com/~/media/webrenewal/support/library/catalog/products/emc/emifil/c30e.ashx?la=en-gb; Package Reference: 1210; Tolerance: 10%
footprint BOUR-CM322522_V (Inductor, 2-Leads, Body 3.2x2.5mm, Pitch 3.05mm)
pins: 1, 2

## CMP-006-000006-1
designator X?, comment CRYSTAL 33MHZ SMD 3225
SMD Crystal Oscillator 33MHz 3.3V 15pF 4-Pin CSMD T/R; Manufacturer: CTS; Manufacturer Part Number 1: 632L3I033M00000; Manufacturer 1: CTS-Frequency Controls; Max Supply Current: 15mA; Frequency Stability: 50ppm; Termination: SMD/SMT; Contact Plating: Gold; Mount: Surface Mount; Category: Oscillators; Operating Supply Voltage: 3.3V; ComponentLink3Description: http://www.ctscorp.com/wp-content/uploads/2015/11/008-0328-0.pdf?src-supplier=Avnet; Load Capacitance: 15pF; ComponentLink1URL: http://www.mouser.com/ds/2/96/008-0328-0-786361.pdf?src-supplier=Mouser; Height: 0.047inch; Source: mits.SchLib; ComponentLink2Description: http://www.ctscorp.com/wp-content/uploads/2015/11/008-0328-0.pdf?src-supplier=Digi-Key; Case/Package: SMD/SMT; ComponentLink1Description: http://www.mouser.com/ds/2/96/008-0328-0-786361.pdf?src-supplier=Mouser; Max Operating Temperature: 85°C; Min Operating Temperature: -40°C; ComponentLink3URL: http://www.ctscorp.com/wp-content/uploads/2015/11/008-0328-0.pdf?src-supplier=Avnet; Manufacturer Part Number: 632L3I033M00000; Design Item ID: CRYSTAL 33MHZ SMD 3225; Supplier Unit Price 1: 1.85; Series: 632; Stock 1: 27; Frequency: 33MHz; Pricing 1: 1=1,85000, 10=1,76900, 50=1,72780, 100=1,48100, 500=1,43990, 1000=1,21363 (USD); Packaging: Tape and Reel; Package Quantity: 3000; ComponentLink2URL: http://www.ctscorp.com/wp-content/uploads/2015/11/008-0328-0.pdf?src-supplier=Digi-Key; RoHS: Yes; Length: 0.126inch; Width: 0.098inch
footprint 4-SMD 3225
footprint 4-SMD 3225
pins: 1, 2, 3, 4

## CMP-006-00006-6
designator L?, comment ELJ-RF2N2DFB  value 2.2µH  Manufacturer: Panasonic  Case/Package: 0402  Shielding: Unshielded  RoHS Compliant: True  Package Description: 2-Pin Surface Mount Device, Body 1 x 0.5 mm  Packaging: TapeandReel  Datasheet Version: Sep-12  Package Quantity: 10000  Current Rating: 400mA  Tolerance: 5%  Min Operating Temperature: -20°C  Core Material: Ceramic  Mounting Technology: SM  Q Factor: 8  Max Operating Temperature: 85°C
Chip Inductor, 2.2 nH, +/- 0.3 nH, 400 mA, -40 to 85 degC, 0402 (1005 Metric), RoHS, Tape and Reel; Datasheet URL: http://www.bourns.com/docs/Product-Datasheets/cm322522.pdf; Package Reference: 0402
footprint SUSUMU-PCMB063T_V (SMD, 2-Leads, Body 7.8x6.7mm)
footprint IND1005X55X20VL5T10 (Chip Inductor, 2-Leads, Body 1.05x0.55mm)
pins: 1, 2

## CMP-006-000007-1
designator X?, comment CRYSTAL 3.58MHZ 20PF SMD
Manufacturer 1: ECEC(ZheJiang E ast Crystal Elec); Manufacturer Part Number 1: C03579J047; eVendor: LCSC; Design Item ID: CRYSTAL 3.58MHZ 20PF SMD; ComponentLink1URL: http://cfd.citizen.co.jp/english/prod-tech/product/pdf/datasheet_AT/HCM49_E.pdf; ComponentLink1Description: http://cfd.citizen.co.jp/english/prod-tech/product/pdf/datasheet_AT/HCM49_E.pdf; Source: mits.SchLib; Supplier Unit Price 1: 0.0976
footprint CFS206
footprint XTAL-SMD
pins: 1 OSC1, 2 OSC2

## CMP-006-00007-3
designator L?, comment LQG15HN2N2S02D  Mounting Technology: SM  Shielding: Unshielded  Packaging: TapeandReel  Package Description: 2-Pin Surface Mount Device, Body 1 x 0.5 mm  Inductance: 2.2µH  Q Factor: 8  Pins: 2  Manufacturer: Murata  Self Resonant Frequency: 6GHz  Max Operating Temperature: 125°C  Case/Package: 0402  Resistance: 0.15Ohm  Current Rating: 300mA  Min Operating Temperature: -55°C  Tolerance: 5%  Core Material: Air  RoHS Compliant: True  Package Quantity: 10000  Datasheet Version: Sep-10
Chip Inductor, 2.2 nH, +/- 0.3 nH, 300 mA, -55 to 125 degC, 0402 (1005 Metric), RoHS, Tape and Reel; Datasheet URL: http://industrial.panasonic.com/cdbs/www-data/pdf/AGA0000/AGA0000C49.pdf; Package Reference: 0402
footprint INDC1005X55X25NL5T10 (Chip Inductor, 2-Leads, Body 1.05x0.55mm, IPC Medium Density)
footprint INDC1005X55X25ML5T10 (Chip Inductor, 2-Leads, Body 1.05x0.55mm, IPC Low Density)
footprint INDC1005X55X25LL5T10 (Chip Inductor, 2-Leads, Body 1.05x0.55mm, IPC High Density)
pins: 1, 2

## CMP-006-000008-1
designator X?, comment CRYSTAL 12MHZ 8PF SMD 3205
CRYSTAL 12MHZ 8PF SMD; Manufacturer: NDK; Part#: NX3225GA-12MHZ- STD-CRG-2; eVendorPrice: 0,73; eVendor: Digi-Key; eVendor#: 644-1173-1-ND; MSRP: 0,38808; Datasheet: http://www.ndk.com/images/products/catalog/c_NX3225GA-STD-CRG-2_e.pdf; Design Item ID: CRYSTAL 12MHZ 8PF SMD 3205; Obs: --; Source: mits.SchLib; MOQ: 1000
footprint 4-SMD 3225
footprint 4-SMD 3225
pins: 1, 2, 3, 4

## CMP-006-00008-6
designator L?, comment LQM2HPN1R0MJ0L  value 1µH  Self Resonant Frequency: 70MHz  Current Rating: 1.5A  Shielding: Shielded  Datasheet Version: Aug-16  RoHS Compliant: True  Case/Package: 1008  Package Description: 2-Pin Surface Mount Device, Body 2.5 x 2 mm  Package Quantity: 3000  Core Material: Ferrite  Tolerance: 20%  Min Operating Temperature: -40°C  Packaging: TapeandReel  Mounting Technology: SM  Max Operating Temperature: 85°C  Resistance: 0.09Ohm  Manufacturer: Murata
Chip Inductor, 1 uH, +/- 20%, 1 MHz, -55 to 125 degC, 1008 (2520 Metric), RoHS, Tape and Reel; Datasheet URL: http://psearch.en.murata.com/inductor/product/LQM2HPN1R0MJ0%23.pdf; Package Reference: 1008
footprint SUSUMU-PCMB063T_V (SMD, 2-Leads, Body 7.8x6.7mm)
footprint INDC2520X120X60NL20T20 (Chip Inductor, 2-Leads, Body 2.70x2.20mm, IPC Medium Density)
footprint INDC2520X120X60LL20T20 (Chip Inductor, 2-Leads, Body 2.70x2.20mm, IPC High Density)
footprint INDC2520X120X60ML20T20 (Chip Inductor, 2-Leads, Body 2.70x2.20mm, IPC Low Density)
pins: 1, 2

## CMP-006-000009-3
designator X?, comment CRYSTAL 32.768kHz 12.5pF
CRYSTAL 32.768 KHZ 12.5 PF; ESR (Equivalent Series Resistance): 35kR; Lead Free: Lead Free; RoHS Compliant: No; Case/Package: Radial; Load Capacitance: 12.5pF
footprint 2-SMD 3215
footprint CRYSTAL 32.768kHz 12.5pF SMD-Footprint-1
pins: 1, 2

## CMP-006-00009-6
designator L?, comment LQM2HPN2R2MG0L  value 2.2µH  Self Resonant Frequency: 40MHz  Current Rating: 1.3A  Package Description: 2-Pin Surface Mounted Device, Body 2.5 x 2 mm  Tolerance: 20%  Max Operating Temperature: 125°C  Mounting Technology: SM  Package Reference: 1008  Core Material: Ferrite  RoHS Compliant: True  Package Quantity: 3000  Manufacturer: Murata  Shielding: Shielded  Packaging: TapeandReel  Min Operating Temperature: -55°C  Datasheet Version: Aug-16
Chip Inductor, 2.2 uH, +/- 20%, -55 to 125 degC, 1008 (2520 Metric), RoHS, Tape and Reel; Case/Package: 1008; Datasheet URL: http://psearch.en.murata.com/inductor/product/LQM2HPN2R2MG0%23.pdf
footprint SUSUMU-PCMB063T_V (SMD, 2-Leads, Body 7.8x6.7mm)
footprint INDC2520X100X60ML20T20 (Chip Inductor, 2-Leads, Body 2.7x2.2mm, IPC Low Density)
footprint INDC2520X100X60LL20T20 (Chip Inductor, 2-Leads, Body 2.7x2.2mm, IPC High Density)
footprint INDC2520X100X60NL20T20 (Chip Inductor, 2-Leads, Body 2.7x2.2mm, IPC Medium Density)
pins: 1, 2

## CMP-006-000010-2
designator X?, comment CRYSTAL 32.7680KHZ 12.5PF T/H
Manufacturer Part Number: CFS-20632768DZFB; Manufacturer: Citizen Finedevice Co Ltd; ESR (Equivalent Series Resistance): 35 kOhm; Frequency Tolerance: ±20ppm; Frequency: 32.768kHz; Operating Mode: Fundamental; Part Status: Active; Stock 1: 82415; Ratings: -; Category: Crystals, Oscillators, Resonators; Frequency Stability: -; ComponentLink1URL: http://cfd.citizen.co.jp/english/prod-tech/product/pdf/datasheet_TF/CFS-145%20CFS-206%20CFV-206_E.pdf; Design Item ID: CRYSTAL 32.7680KHZ 12.5PF T/H; RoHS: RoHS Compliant; Load Capacitance: 12.5pF; Source: mits.SchLib; Pricing 1: 1=0.24, 10=0.2, 50=0.18, 100=0.16, 500=0.152, 1000=0.128, 2500=0.12, 5000=0.116, 10000=0.112 (USD); Package / Case: Cylindrical Can, Radial; Packaging: Bulk; Mounting Type: Through Hole; Operating Temperature: -20°C ~ 70°C; ComponentLink1Description: http://cfd.citizen.co.jp/english/prod-tech/product/pdf/datasheet_TF/CFS-145%20CFS-206%20CFV-206_E.pdf; Size / Dimension: 0.075" Dia (1.90mm); Type: kHz Crystal (Tuning Fork); Height - Seated (Max): 0.244" (6.20mm)
footprint CFS206
footprint CRYSTAL 32.768kHz 12.5pF SMD-Footprint-1
pins: 1 OSC1, 2 OSC2

## CMP-006-00010-6
designator L?, comment LQP15MN3N6B02D  value 3.6nH  Core Material: Ferrite  Self Resonant Frequency: 6GHz  Current Rating: 170mA  Datasheet Version: Apr-16  Case/Package: 0402  Mounting Technology: SM  Shielding: Unshielded  Min Operating Temperature: -40°C  RoHS Compliant: True  Package Description: 2-Pin Surface Mount Device, Body 1 x 0.5 mm  Max Operating Temperature: 85°C  Q Factor: 13  Package Quantity: 10000  Packaging: TapeandReel  Manufacturer: Murata
Inductor, 500 MHz, 170 mA, 0.5 Ohm, -40 to 85 degC, 01005 (0402 Metric), RoHS, Tape and Reel; Datasheet URL: http://download.siliconexpert.com/pdfs/2016/4/21/8/25/31/646/mrt_/manual/797549851250188lqp15mn3n6b0223.pdf; Package Reference: 0402
footprint SUSUMU-PCMB063T_V (SMD, 2-Leads, Body 7.8x6.7mm)
footprint MURA-LQP15MN3N6B02D-2_M (Chip Inductor, 2-Leads, Body 1.10x0.60mm, IPC Low Density)
footprint MURA-LQP15MN3N6B02D-2_N (Chip Inductor, 2-Leads, Body 1.10x0.60mm, IPC Medium Density)
footprint MURA-LQP15MN3N6B02D-2_L (Chip Inductor, 2-Leads, Body 1.10x0.60mm, IPC High Density)
pins: 1, 2

## CMP-006-00011-3
designator L?, comment PE-92108KNL  Mounting Technology: TH  Current Rating: 3.6A  Lead Pitch: 11.44mm  Min Operating Temperature: -40°C  RoHS Compliant: True  Inductance: 67µH  Package Quantity: 55  Manufacturer: Pulse Electronics  Packaging: Tray  Datasheet Version: Feb-15  Max Operating Temperature: 130°C  Package Description: 2-Pin Through Hole Device, Body 24.14 x 15.5 mm  Tolerance: 20%  Shielding: Unshielded  Case/Package: Radial  Resistance: 0.045Ohm  Package Reference: PE-92108KNL-KM4-2
THT Power Inductor, 67 uH, 0.045 Ohm, -40 to 130 degC, 2-Pin THD (KM4), RoHS, Tray; Inductance Tolerance: 20%; Datasheet URL: http://productfinder.pulseeng.com/products/datasheets/P635.pdf
footprint PULS-PE-92108KNL-KM4-2 (THD, 2-Leads, Body 24.64x15.5mm)
pins: 1, 2

## CMP-006-00012-6
designator L?, comment RL622-100K-RC  value 10µH  Resistance: 0.045Ohm  Lead Pitch: 5mm  Min Operating Temperature: -55°C  Datasheet Version: Aug-10  Package Reference: INDR62-500-1100X850X1100  Package Description: 2-Pin Radial Lead, Dia 8.5 mm, Pitch 5 mm  Package Quantity: 100  Core Material: Ferrite  Current Rating: 3A  Packaging: Bulk  Mounting Technology: TH  Case/Package: Radial  Pins: 2  Inductance Tolerance: 10%  Diameter: 8.5mm  Shielding: Unshielded  Max Operating Temperature: 105°C  RoHS Compliant: True  Manufacturer: Bourns  Self Resonant Frequency: 14MHz  Q Factor: 50
Radial Inductor, 10 uH, +/- 10%, 3 A, -55 to 105 degC, 2-Pin THD, RoHS, Bulk; Datasheet URL: http://www.bourns.com/docs/Product-Datasheets/rl622_series.pdf; Tolerance: 10%
footprint SUSUMU-PCMB063T_V (SMD, 2-Leads, Body 7.8x6.7mm)
footprint INDR62-500-1100X850X1100 (THD, 2-Leads, Dia 8.5mm, Pitch 5mm)
pins: 1, 2

## CMP-006-00013-6
designator L?, comment RL622-101K-RC  value 100µH  Pins: 2  Inductance Tolerance: 10%  Packaging: Bulk  Q Factor: 20  Shielding: Unshielded  Manufacturer: Bourns  Diameter: 8.5mm  Core Material: Ferrite  RoHS Compliant: True  Max Operating Temperature: 105°C  Self Resonant Frequency: 3.7MHz  Package Quantity: 100  Resistance: 0.28Ohm  Package Reference: INDR62-500-1100X850X1100  Mounting Technology: TH  Current Rating: 910mA  Lead Pitch: 5mm  Datasheet Version: Aug-10  Min Operating Temperature: -55°C  Package Description: 2-Pin Radial Lead, Dia 8.5 mm, Pitch 5 mm  Case/Package: Radial
Radial Inductor, 100 uH, +/- 10%, 0.91 A, -55 to 105 degC, 2-Pin THD, RoHS, Bulk; Datasheet URL: http://www.bourns.com/docs/Product-Datasheets/rl622_series.pdf; Tolerance: 10%
footprint SUSUMU-PCMB063T_V (SMD, 2-Leads, Body 7.8x6.7mm)
footprint INDR62-500-1100X850X1100 (THD, 2-Leads, Dia 8.5mm, Pitch 5mm)
pins: 1, 2

## CMP-006-00014-6
designator L?, comment RL622-102K-RC  value 1mH  Tolerance: 10%  Shielding: Unshielded  Package Reference: INDR62-500-1100X850X1100  Mounting Technology: TH  Lead Pitch: 5mm  Self Resonant Frequency: 1.3MHz  Packaging: Bulk  Package Description: 2-Pin Radial Lead, Dia 8.5 mm, Pitch 5 mm  Max Operating Temperature: 105°C  Package Quantity: 100  Core Material: Ferrite  Q Factor: 50  Manufacturer: Bourns  Current Rating: 290mA  Resistance: 2.9Ohm  Datasheet Version: Aug-10  Pins: 2  Case/Package: Radial  Diameter: 8.5mm  Min Operating Temperature: -55°C  RoHS Compliant: True
Radial Inductor, 1 mH, +/- 10%, 290 mA, -55 to 105 degC, 2-Pin THD, RoHS, Bulk; Datasheet URL: https://www.bourns.com/pdfs/rl622_series.pdf; Inductance Tolerance: 10%
footprint SUSUMU-PCMB063T_V (SMD, 2-Leads, Body 7.8x6.7mm)
footprint INDR62-500-1100X850X1100 (THD, 2-Leads, Dia 8.5mm, Pitch 5mm)
pins: 1, 2

## CMP-006-00015-6
designator L?, comment RL622-1R0K-RC  value 1µH  Case/Package: Radial  Self Resonant Frequency: 150MHz  Max Operating Temperature: 105°C  Lead Pitch: 5mm  Manufacturer: Bourns  Tolerance: 10%  Current Rating: 10A  Core Material: Ferrite  Datasheet Version: Aug-10  Mounting Technology: TH  Packaging: Bulk  Package Description: 2-Pin Radial Lead, Dia 8.5 mm, Pitch 5 mm  Min Operating Temperature: -55°C  RoHS Compliant: True  Package Reference: INDR62-500-1100X850X1100  Shielding: Unshielded  Diameter: 8.5mm  Package Quantity: 100  Resistance: 0.013Ohm
Radial Inductor, 1 uH, +/- 10%, 10 A, -55 to 105 degC, 2-Pin THD, RoHS, Bulk; Datasheet URL: http://www.bourns.com/docs/Product-Datasheets/rl622_series.pdf; Inductance Tolerance: 10%
footprint SUSUMU-PCMB063T_V (SMD, 2-Leads, Body 7.8x6.7mm)
footprint INDR62-500-1100X850X1100 (THD, 2-Leads, Dia 8.5mm, Pitch 5mm)
pins: 1, 2

## CMP-006-00016-6
designator L?, comment RLB9012-472KL  value 4.7µH  Manufacturer: Bourns  Lead Pitch: 5mm  Core Material: Ferrite  Datasheet Version: Mar-15  Package Reference: INDR70-500-1220X900X1220  Package Description: 2-Pin Through Hole Device, Dia 9 mm, Height 12.2 mm  Min Operating Temperature: -55°C  Shielding: Unshielded  Mounting Technology: TH  Current Rating: 240mA  Tolerance: 10%  Pins: 2  Q Factor: 15  RoHS Compliant: True  Packaging: Bulk  Package Quantity: 200  Self Resonant Frequency: 500kHz  Max Operating Temperature: 125°C  Case/Package: Radial  Inductance Tolerance: 5%
Radial Inductor, 4.7 mH, +/- 10%, 0.24 A, -55 to 125 degC, 2-Pin THD, RoHS, Bulk; Datasheet URL: http://www.bourns.com/docs/Product-Datasheets/rlb9012.pdf
footprint SUSUMU-PCMB063T_V (SMD, 2-Leads, Body 7.8x6.7mm)
footprint INDR70-500-1220X900X1220 (THD, 2-Leads, Dia 9mm)
pins: 1, 2

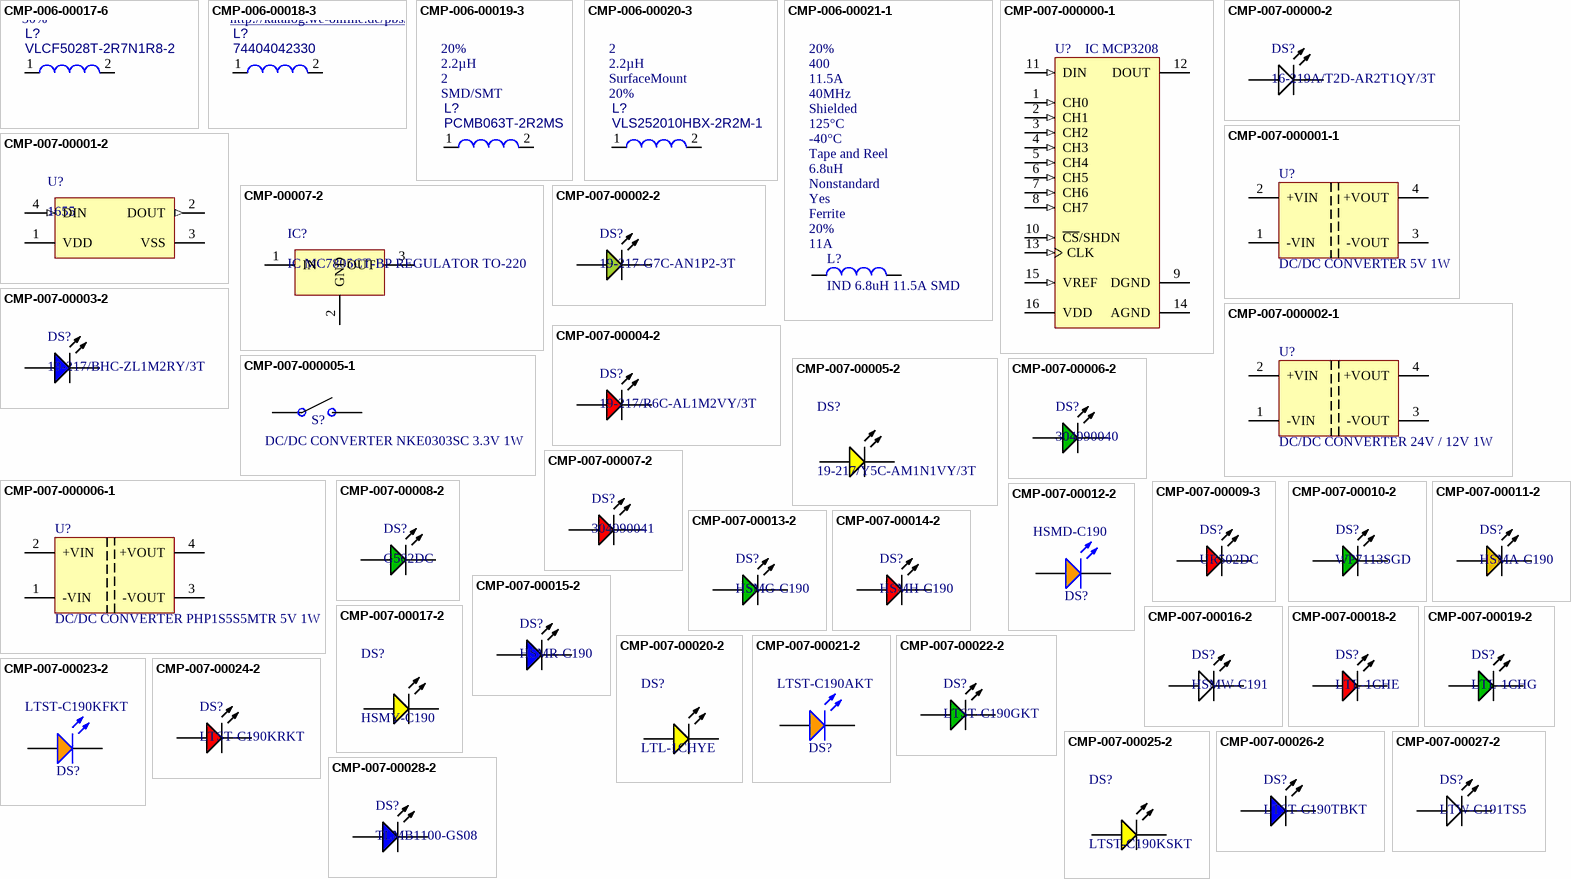
[diagram p14: symbols CMP-006-00017-6 to CMP-007-00028-2]

## CMP-006-00017-6
designator L?, comment VLCF5028T-2R7N1R8-2  value 2.7µH  Tolerance: 30%  Package Quantity: 500  Manufacturer: TDK  Datasheet Version: Apr-16  Resistance: 0.033Ohm  Max Operating Temperature: 105°C  RoHS Compliant: True  Shielding: Shielded  Min Operating Temperature: -40°C  Packaging: TapeandReel  Core Material: Ferrite  Current Rating: 1.82A  Package Description: 2-Pin Surface Mount Device, Body 5.2 x 5.3 mm  Mounting Technology: SM  Package Reference: VLCF5028-2  Case/Package: 5028
Inductor for Power Circuits, 2.7 uH, +/- 30%,100 KHz, 1.82 A, -40 to 105 degC, 2-Pin SMD, RoHS, Reel; Datasheet URL: https://product.tdk.com/info/en/catalog/datasheets/inductor_commercial_power_vlcf5028-2_en.pdf; Saturation Current: 1.82A; Inductance Tolerance: 30%
footprint SUSUMU-PCMB063T_V (SMD, 2-Leads, Body 7.8x6.7mm)
footprint TDK-VLCF5028-2_V (SMD, 2-Leads, Body 5.2x5.3mm)
pins: 1, 2

## CMP-006-00018-3
designator L?, comment 74404042330  value 33µH  ComponentLink2Description: Datasheet  Pins: 2  ComponentLink1Description: Manufacturer URL  Tolerance: 20%
WE-LQS SMD Power Inductor, L=33 µH; ComponentLink2URL: http://katalog.we-online.de/pbs/datasheet/74404042330.pdf; ComponentLink1URL: http://www.we-online.com
footprint SUSUMU-PCMB063T_V (SMD, 2-Leads, Body 7.8x6.7mm)
footprint WE-LQS 4018 (SMD Power Inductor, 2-Leads, Body 4.0x4.0mm)
pins: 1, 2
